# Altium footprint library Mine.PcbLib: 306 footprints (part 15 of 20)
Each footprint in its own frame and in the unit in brackets; x right, y up, seen from the top. Pads: shape width x height; smd on the part's side, far side on the other; paste and mask are expansions set on the pad; w line width, h text height; cw(c..) or ccw(c..) is an arc to the next point about the centre after c.
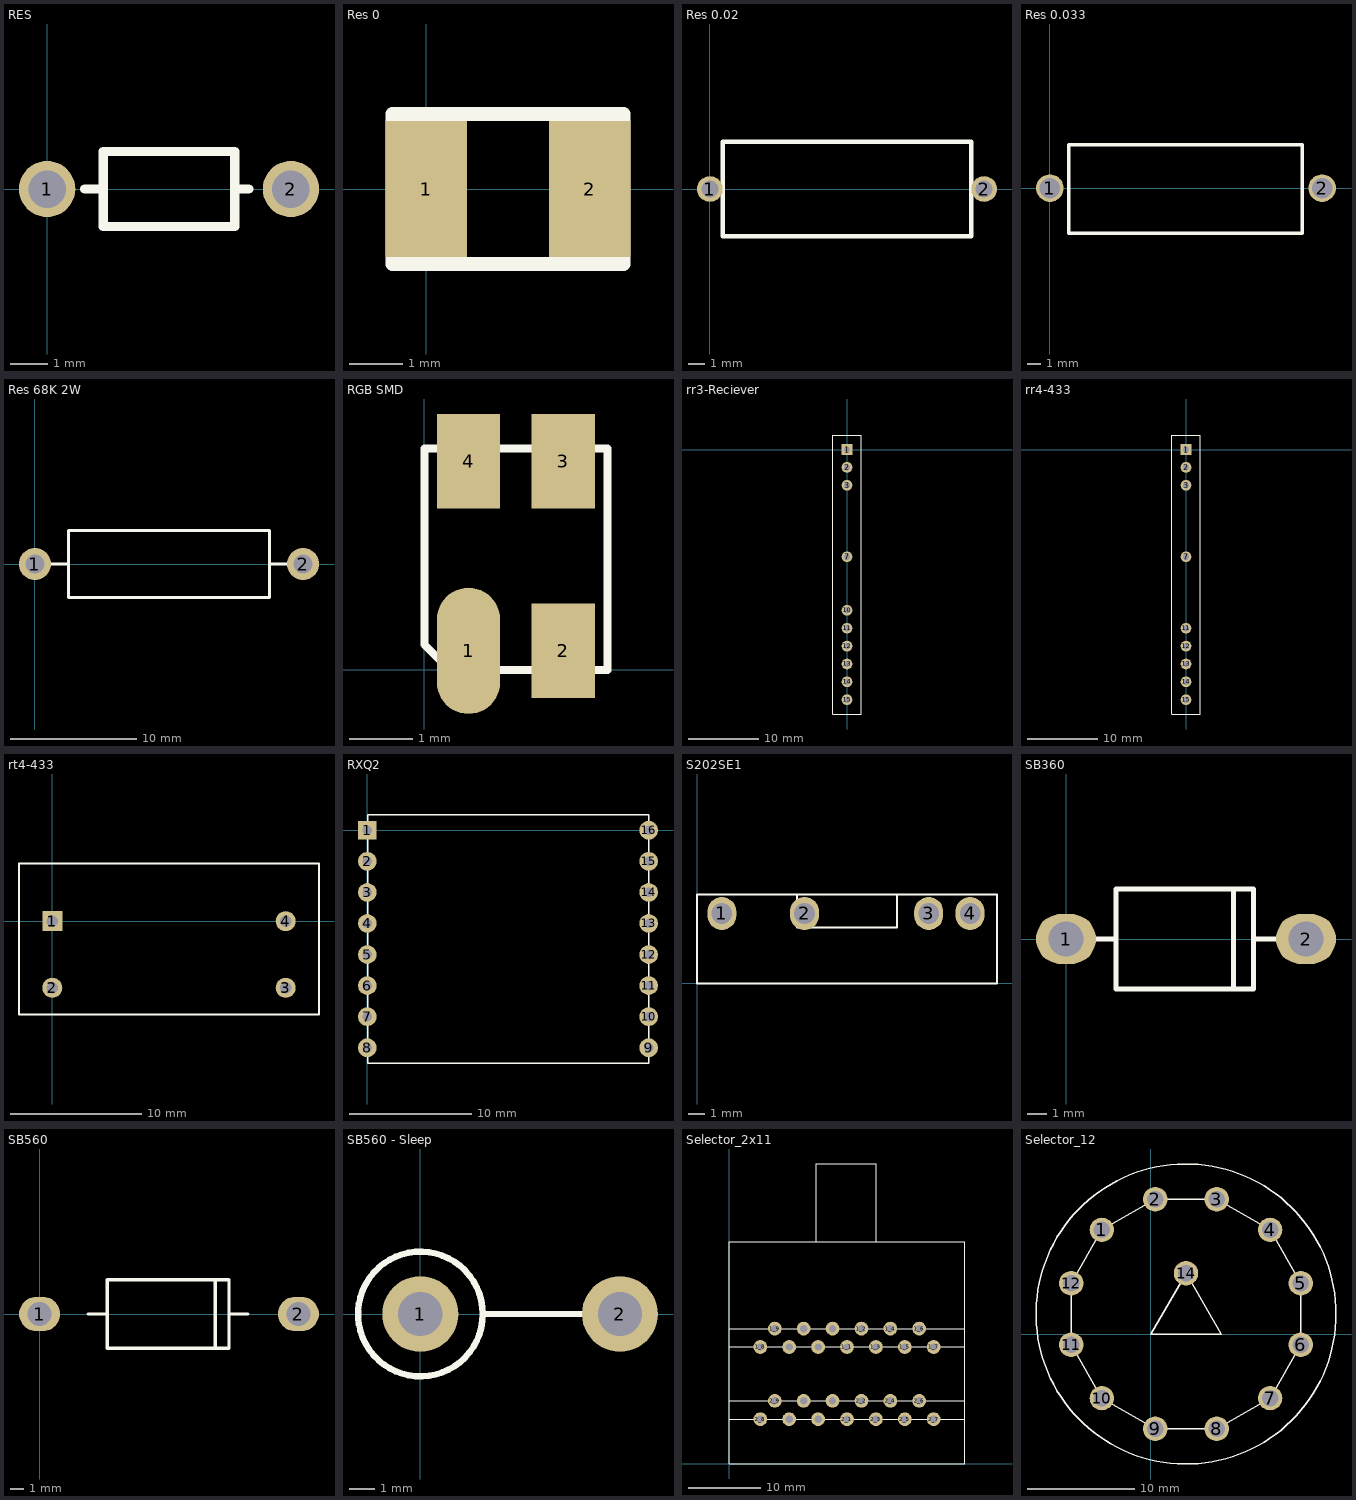
[diagram p14: the footprints below, top view; thin cyan lines are the x and y axes]

## RES [mil]
pads (2):
  round 60 hole 40: 1(0,0) 2(260,0)
Top Overlay:
  lines w10: 40,0 60,0 ; 200,0 215,0 ; 60,0 60,40 200,40 200,-40 60,-40 60,0

## Res 0 [mil]
pads (2):
  rect 60x100 smd: 1(0,0) 2(120,0)
Top Overlay:
  lines w10: -25,-55 -25,55 145,55 145,-55 -25,-55

## Res 0.02 [mil]
height 216.54
pads (2):
  round 60 hole 40: 1(0,0) 2(640,0)
Top Overlay:
  lines w10: 30,-110 30,110 610,110 610,-110 30,-110

## Res 0.033 [mil]
height 255.91
pads (2):
  round 80 hole 60: 1(0,0) 2(787.4,0)
Top Overlay:
  lines w10: 55,-130 55,125 730,125 730,-130 55,-130

## Res 68K 2W [mil]
pads (2):
  round 100 hole 60: 1(0,0) 2(840,0)
Top Overlay:
  lines w10: 50,0 105,0 ; 735,0 790,0 ; 105,0 105,-105 735,-105 735,105 105,105 105,0

## RGB SMD [mm]
height 2
pads (4):
  oval 1x2 smd: 1(0.7,0.3)
  rect 1x1.5 smd: 2(2.2,0.3) 3(2.2,3.3) 4(0.7,3.3)
Top Overlay:
  lines w0.127: 0,0.4 0.4,0 0.5,0 2.9,0 2.9,3.5 0,3.5 0,0.4

## rr3-Reciever [mil]
pads (10):
  rect 60x60 hole 35.43: 1(0,0)
  round 60 hole 35.43: 2(0,-100) 3(0,-200) 7(0,-600) 10(0,-900) 11(0,-1000) 12(0,-1100) 13(0,-1200) 14(0,-1300) 15(0,-1400)
Top Overlay:
  lines w5: -80,-1480 80,-1480 80,80 -80,80 -80,-1480

## rr4-433 [mil] "Reciever"
pads (9):
  rect 60x60 hole 35.43: 1(0,0)
  round 60 hole 35.43: 2(0,-100) 3(0,-200) 7(0,-600) 11(0,-1000) 12(0,-1100) 13(0,-1200) 14(0,-1300) 15(0,-1400)
Top Overlay:
  lines w5: -80,-1480 80,-1480 80,80 -80,80 -80,-1480

## rt4-433 [mil] "transmitter"
pads (4):
  rect 60x60 hole 35.43: 1(0,0)
  round 60 hole 35.43: 2(0,-200) 3(700,-200) 4(700,0)
Top Overlay:
  lines w5: -100,-280 800,-280 800,173 -100,173 -100,-280

## RXQ2 [mil] "Tranciever"
height 118.11
pads (16):
  rect 60x60 hole 30: 1(0,0)
  round 60 hole 30: 2(0,-100) 3(0,-200) 4(0,-300) 5(0,-400) 6(0,-500) 7(0,-600) 8(0,-700) 9(905.51,-700) 10(905.51,-600) 11(905.51,-500) 12(905.51,-400) 13(905.51,-300) 14(905.51,-200) 15(905.51,-100) 16(905.51,0)
Top Overlay:
  lines w5: 1,-750 1,50 906,50 906,-750 1,-750

## S202SE1 [mil]
height 1259.84
pads (4):
  oval 70x80 hole 50: 1(60,169.29) 2(260,169.29) 3(560,169.29) 4(660,169.29)
Top Overlay:
  lines w5: 241.67,215 241.67,135 483.33,135 483.33,215 ; 0,0 725,0 725,215 0,215 0,0

## SB360 [mil]
height 236.22
pads (2):
  oval 120x100 hole 70: 1(0,0) 2(480,0)
Top Overlay:
  lines w10: 45,0 100,0 ; 335,-100 335,100 ; 375,0 430,0 ; 100,0 100,-100 375,-100 375,100 100,100 100,0

## SB560 [mil]
height 196.85
pads (2):
  oval 120x100 hole 70: 1(0,0) 2(753.03,0)
Top Overlay:
  lines w10: 141.85,0 196.85,0 ; 511.18,-100 511.18,100 ; 551.18,0 606.18,0 ; 196.85,0 196.85,100 551.18,100 551.18,-100 196.85,-100 196.85,0

## SB560 - Sleep [mil]
height 590.55
pads (2):
  round 120 hole 70: 1(0,0) 2(314.96,0)
Top Overlay:
  circle w10: c0,0 r98.43
  lines w10: 98.43,0 314.96,0

## Selector_2x11 [mm] "Sealed industrial selector 2x11"
height 30
pads (26):
  round 1.905 hole 1.016: 1_1(16.3,16.2) 1_2(18.3,18.74) 1_3(20.3,16.2) 1_4(22.3,18.74) 1_5(24.3,16.2) 1_6(26.3,18.74) 1_7(28.3,16.2) 1_8(4.3,16.2) 1_9(6.3,18.74) 1_10(8.3,16.2) 1_11(10.3,18.74) 1_12(12.3,16.2) 2_1(16.3,6.2) 2_2(18.3,8.74) 2_3(20.3,6.2) 2_4(22.3,8.74) 2_5(24.3,6.2) 2_6(26.3,8.74) 2_7(28.3,6.2) 2_8(4.3,6.2) 2_9(6.3,8.74) 2_10(8.3,6.2) 2_11(10.3,8.74) 2_12(12.3,6.2) ""(14.3,8.74) ""(14.3,18.74)
Top Overlay:
  lines w0.127: 0,6.2 32.6,6.2 ; 0,8.74 32.6,8.74 ; 0,16.2 32.6,16.2 ; 0,18.74 32.6,18.74 ; 12.065,30.8 12.065,41.529 20.32,41.529 20.32,30.8 ; 0,0 32.6,0 32.6,30.8 0,30.8 0,0

## Selector_12 [mil] "12 State Selector"
height 590.55
pads (13):
  round 90 hole 60: 1(-179.01,384.01) 2(16.89,497.12) 3(243.11,497.12) 4(439.01,384.01) 5(552.12,188.11) 6(552.12,-38.11) 7(439.01,-234.01) 8(243.11,-347.12) 9(16.89,-347.12) 10(-179.01,-234.01) 11(-292.12,-38.11) 12(-292.12,188.11) 14(130,224.61)
Top Overlay:
  circle w5: c130,75 r551.18
  lines w5: -292.12,-38.11 -292.12,188.11 -179.01,384.01 16.89,497.12 243.11,497.12 439.01,384.01 552.12,188.11 552.12,-38.11 439.01,-234.01 243.11,-347.12 16.89,-347.12 -179.01,-234.01 -292.12,-38.11 ; 0.44,0.2 259.56,0.2 130,224.61 0.44,0.2